# Altium footprint library adafruit.PCBLIB: 648 footprints (part 35 of 41)
Each footprint in its own frame and in the unit in brackets; x right, y up, seen from the top. Pads: shape width x height; smd on the part's side, far side on the other; paste and mask are expansions set on the pad; w line width, h text height; cw(c..) or ccw(c..) is an arc to the next point about the centre after c.
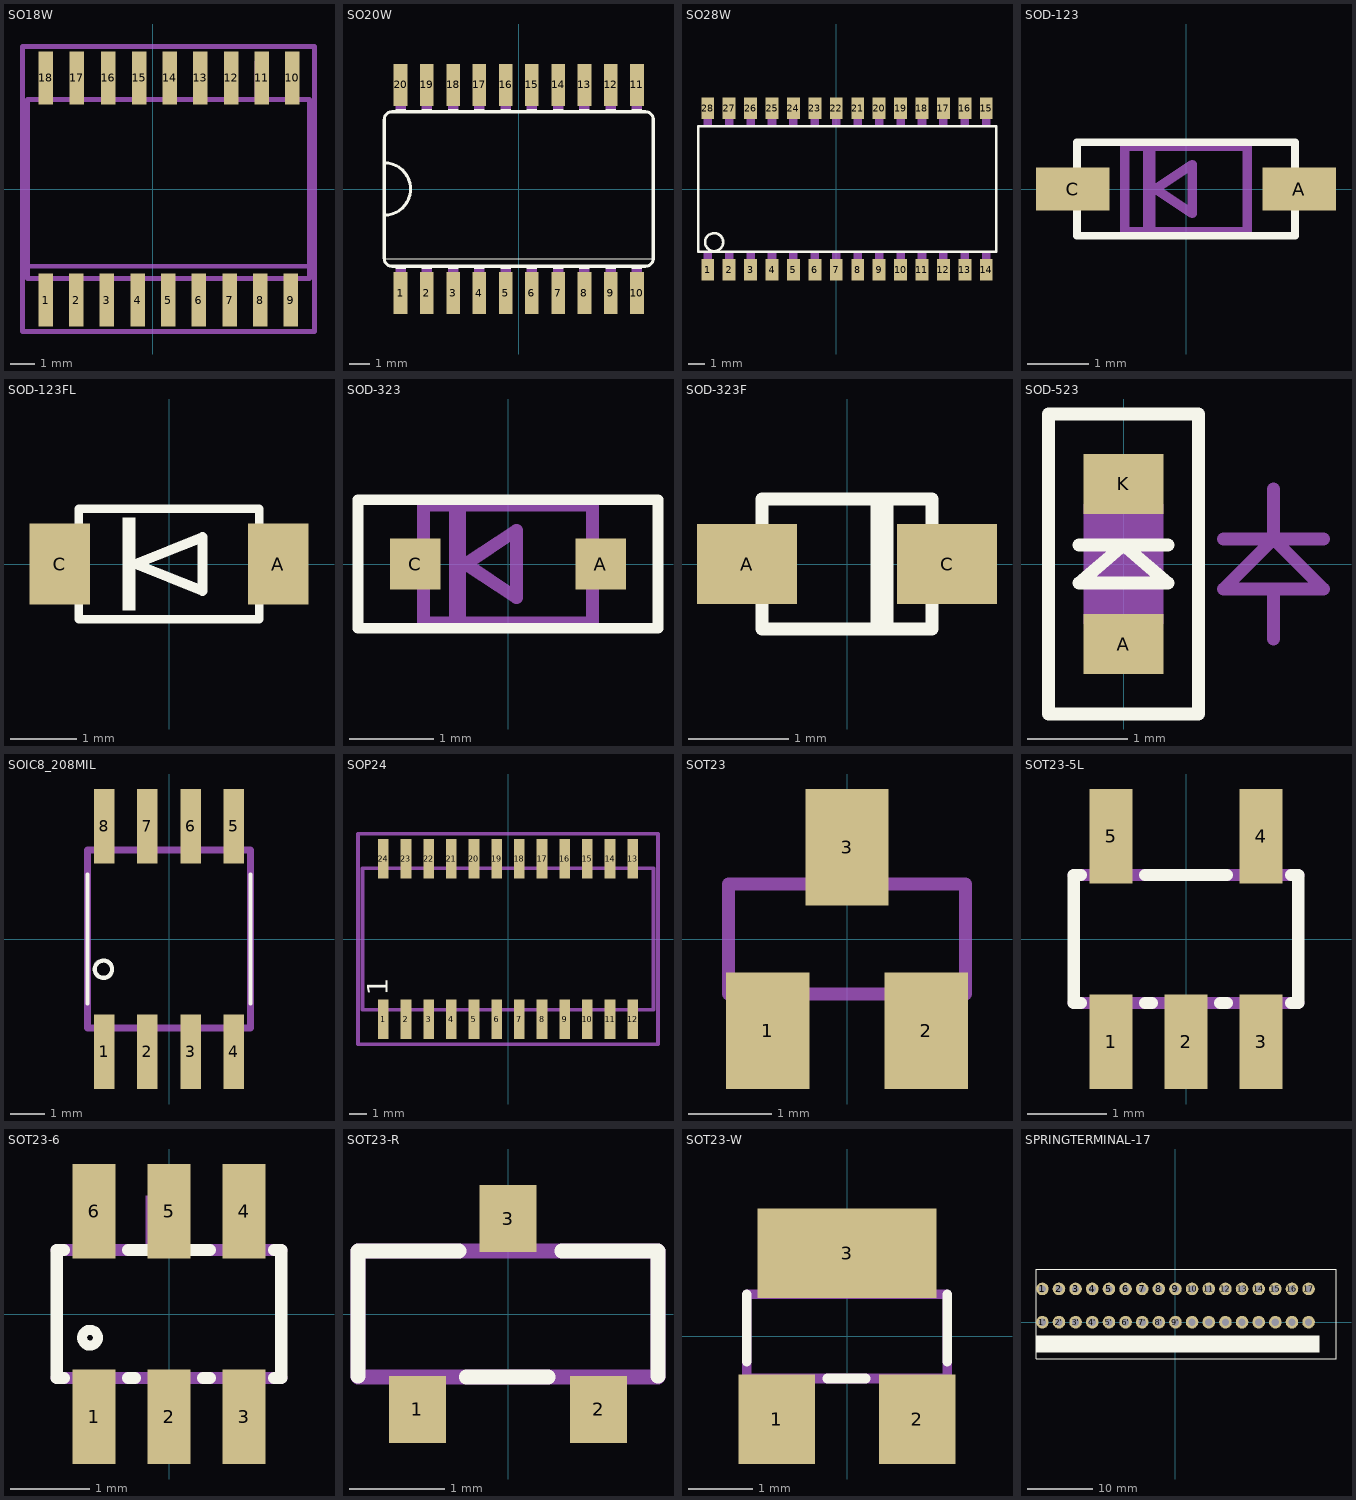
[diagram p34: the footprints below, top view; thin cyan lines are the x and y axes]

## SO18W [mil]
pads (18):
  rect 23.62x86.61 smd: 1(-175,-181.1) 2(-125,-181.1) 3(-75,-181.1) 4(-25,-181.1) 5(25,-181.1) 6(75,-181.1) 7(125,-181.1) 8(175,-181.1) 9(225,-181.1) 10(227.36,181.1) 11(177.36,181.1) 12(127.36,181.1) 13(77.36,181.1) 14(27.36,181.1) 15(-22.64,181.1) 16(-72.64,181.1) 17(-123.82,181.1) 18(-175,181.1)
Mechanical 16:
  rectangle: -184.65,-209.45 -165.35,-149.61
  rectangle: -134.65,-209.45 -115.35,-149.61
  rectangle: -84.65,-209.45 -65.35,-149.61
  rectangle: -34.65,-209.45 -15.35,-149.61
  rectangle: 15.35,-209.45 34.65,-149.61
  rectangle: 65.35,-209.45 84.65,-149.61
  rectangle: 115.35,-209.45 134.65,-149.61
  rectangle: 165.35,-209.45 184.65,-149.61
  rectangle: 215.35,149.61 234.65,209.45
  rectangle: 165.35,149.61 184.65,209.45
  rectangle: 116.53,149.61 135.83,209.45
  rectangle: 66.53,149.61 85.83,209.45
  rectangle: 16.53,149.61 35.83,209.45
  rectangle: -33.47,149.61 -14.17,209.45
  rectangle: -83.47,149.61 -64.17,209.45
  rectangle: -133.47,149.61 -114.17,209.45
  rectangle: -184.65,149.61 -165.35,209.44
  rectangle: 215.35,-209.44 234.65,-149.61
  lines w8: -204.33,-125.98 -204.33,-145.67 255.51,-145.67 255.51,-125.98 ; -204.33,-125.98 -204.33,145.67 255.51,145.67 255.51,-125.98 ; -204.33,-125.98 255.51,-125.98
Mechanical 27:
  lines w7.87: -212.4,-232.28 263.58,-232.28 263.58,232.28 -212.4,232.28 -212.4,-232.28

## SO20W [mil]
pads (20):
  rect 26x80 smd: 1(-225,-198) 2(-175,-198) 3(-125,-198) 4(-75,-198) 5(-25,-198) 6(25,-198) 7(75,-198) 8(125,-198) 9(175,-198) 10(225,-198) 11(225,198) 12(175,198) 13(125,198) 14(75,198) 15(25,198) 16(-25,198) 17(-75,198) 18(-125,198) 19(-175,198) 20(-225,198)
Top Overlay:
  rectangle: 215,-152 235,-147
  rectangle: 165,-152 185,-147
  rectangle: 215,147 235,152
  rectangle: 165,147 185,152
  rectangle: 115,147 135,152
  rectangle: 65,147 85,152
  rectangle: 15,147 35,152
  rectangle: -35,147 -15,152
  rectangle: -85,147 -65,152
  rectangle: -135,147 -115,152
  rectangle: -185,147 -165,152
  rectangle: -235,147 -215,152
  rectangle: 115,-152 135,-147
  rectangle: 65,-152 85,-147
  rectangle: 15,-152 35,-147
  rectangle: -35,-152 -15,-147
  rectangle: -85,-152 -65,-147
  rectangle: -135,-152 -115,-147
  rectangle: -185,-152 -165,-147
  rectangle: -235,-152 -215,-147
  lines w2: -255,-133 255,-133
  lines w6: -256,-50 ccw(c-256,0) -256,50 ; -256,-50 -256,-132 ccw(c-241,-132) -241,-147 241,-147 ccw(c241,-132) 256,-132 256,132 ccw(c241,132) 241,147 -241,147 ccw(c-241,132) -256,132 -256,50 ; -256,-50 -256,50
Mechanical 16:
  rectangle: 215,-210 235,-152
  rectangle: 165,-210 185,-152
  rectangle: 215,152 235,210
  rectangle: 165,152 185,210
  rectangle: 115,152 135,210
  rectangle: 65,152 85,210
  rectangle: 15,152 35,210
  rectangle: -35,152 -15,210
  rectangle: -85,152 -65,210
  rectangle: -135,152 -115,210
  rectangle: -185,152 -165,210
  rectangle: -235,152 -215,210
  rectangle: 115,-210 135,-152
  rectangle: 65,-210 85,-152
  rectangle: 15,-210 35,-152
  rectangle: -35,-210 -15,-152
  rectangle: -85,-210 -65,-152
  rectangle: -135,-210 -115,-152
  rectangle: -185,-210 -165,-152
  rectangle: -235,-210 -215,-152

## SO28W [mil]
pads (28):
  rect 30x50 smd: 1(-300,-188.19) 2(-250,-188.19) 3(-200,-188.19) 4(-150,-188.19) 5(-100,-188.19) 6(-50,-188.19) 7(0,-188.19) 8(50,-188.19) 9(100,-188.19) 10(150,-188.19) 11(200,-188.19) 12(250,-188.19) 13(300,-188.19) 14(350,-188.19) 15(350,188.19) 16(300,188.19) 17(250,188.19) 18(200,188.19) 19(150,188.19) 20(100,188.19) 21(50,188.19) 22(0,188.19) 23(-50,188.19) 24(-100,188.19) 25(-150,188.19) 26(-200,188.19) 27(-250,188.19) 28(-300,188.19)
Top Overlay:
  circle w6: c-285,-124 r21
  lines w6: -322,-146.19 373,-146.19 373,146.19 -322,146.19 -322,-146.19
Mechanical 16:
  rectangle: -310,-207.19 -290,-147.19
  rectangle: -260,-207.19 -240,-147.19
  rectangle: -210,-207.19 -190,-147.19
  rectangle: -160,-207.19 -140,-147.19
  rectangle: -110,-207.19 -90,-147.19
  rectangle: -60,-207.19 -40,-147.19
  rectangle: -10,-207.19 10,-147.19
  rectangle: 40,-207.19 60,-147.19
  rectangle: 90,-207.19 110,-147.19
  rectangle: 140,-207.19 160,-147.19
  rectangle: 190,-207.19 210,-147.19
  rectangle: 240,-207.19 260,-147.19
  rectangle: 290,-207.19 310,-147.19
  rectangle: 340,-207.19 360,-147.19
  rectangle: 340,147.19 360,207.19
  rectangle: 290,147.19 310,207.19
  rectangle: 240,147.19 260,207.19
  rectangle: 190,147.19 210,207.19
  rectangle: 140,147.19 160,207.19
  rectangle: 90,147.19 110,207.19
  rectangle: 40,147.19 60,207.19
  rectangle: -10,147.19 10,207.19
  rectangle: -60,147.19 -40,207.19
  rectangle: -110,147.19 -90,207.19
  rectangle: -160,147.19 -140,207.19
  rectangle: -210,147.19 -190,207.19
  rectangle: -260,147.19 -240,207.19
  rectangle: -310,147.19 -290,207.19

## SOD-123 [mil]
pads (2):
  rect 47.24x27.56 smd: A(72.83,0) C(-72.83,0)
Top Overlay:
  lines w5: -70,-30 70,-30 70,30 -70,30 -70,-30
Mechanical 16:
  rectangle: -27.56,-27.56 -19.69,27.56
  lines w6: -39.37,-27.56 39.37,-27.56 39.37,27.56 -39.37,27.56 -39.37,-27.56 ; -19.69,0 3.94,15.75 3.94,-15.75 -19.69,0

## SOD-123FL [mil]
pads (2):
  rect 35.83x48.03 smd: A(64.47,0) C(-64.47,0)
Top Overlay:
  rectangle: -27.56,-27.56 -19.69,27.56
  lines w5: -53.15,-32.48 53.15,-32.48 53.15,32.48 -53.15,32.48 -53.15,-32.48
  lines w6: -19.69,0 19.69,15.75 19.69,-15.75 -19.69,0

## SOD-323 [mil]
pads (2):
  rect 23.62x23.62 smd: A(43.31,0) C(-43.31,0)
Top Overlay:
  lines w5: -70,-30 -70,30 70,30 70,-30 -70,-30
Mechanical 16:
  rectangle: -27.56,-27.56 -19.69,27.56
  lines w6: -39.37,-27.56 -39.37,27.56 39.37,27.56 39.37,-27.56 -39.37,-27.56 ; -19.69,0 3.94,-15.75 3.94,15.75 -19.69,0
  text "41" at 21.93,11.48 h37.2

## SOD-323F [mm]
pads (2):
  rect 1x0.8 smd: A(-1,0) C(1,0)
Top Overlay:
  lines w0.127: 0.3,0.6 0.3,-0.6 0.4,-0.6 0.4,0.6 ; -0.85,-0.65 -0.85,0.65 0.85,0.65 0.85,-0.65 -0.85,-0.65
Mechanical 16:
  lines w0.127: -0.9,-0.2 -1.2,-0.2 -1.2,0.2 -0.9,0.2 ; 0.9,-0.2 1.2,-0.2 1.2,0.2 0.9,0.2

## SOD-523 [mil]
pads (2):
  rect 31.5x23.62 smd: A(0,-31.5) K(0,31.5)
Top Overlay:
  lines w5: -17.5,7.5 17.5,7.5 ; -29.53,-59.06 -29.53,59.06 29.53,59.06 29.53,-59.06 -29.53,-59.06 ; -17.5,-7.5 0,7.5 17.5,-7.5 -17.5,-7.5
Mechanical 16:
  rectangle: -5.91,23.62 5.91,31.5
  rectangle: -5.91,-31.5 5.91,-23.62
  rectangle: -15.75,-23.62 15.75,23.62
  lines w5: 39.37,9.84 59.06,9.84 ; 59.06,-29.53 59.06,-9.84 ; 59.06,29.53 59.06,9.84 ; 78.74,9.84 59.06,9.84 ; 59.06,-9.84 78.74,-9.84 59.06,9.84 ; 59.06,-9.84 39.37,-9.84 59.06,9.84

## SOIC8_208MIL [mil]
pads (8):
  rect 23.62x86.61 smd: 1(-75,-130.51) 2(-25,-130.51) 3(25,-130.51) 4(75,-130.51) 5(75,130.51) 6(25,130.51) 7(-25,130.51) 8(-75,130.51)
Top Overlay:
  circle w5: c-76,-35 r10
  lines w5: -94.49,-74.8 -94.49,74.8 ; 94.49,-74.8 94.49,74.8
Mechanical 16:
  rectangle: -84.65,106.89 -65.35,150.2
  rectangle: -34.65,106.89 -15.35,150.2
  rectangle: 15.35,106.89 34.65,150.2
  rectangle: 65.35,106.89 84.65,150.2
  rectangle: 65.35,-150.2 84.65,-106.89
  rectangle: 15.35,-150.2 34.65,-106.89
  rectangle: -34.65,-150.2 -15.35,-106.89
  rectangle: -84.65,-150.2 -65.35,-106.89
  lines w8: -94.49,-102.95 -94.49,102.95 94.49,102.95 94.49,-102.95 -94.49,-102.95

## SOP24 [mil]
pads (24):
  rect 23.62x86.61 smd: 1(-275,-177.17) 2(-225,-177.17) 3(-175,-177.17) 4(-125,-177.17) 5(-75,-177.17) 6(-25,-177.17) 7(25,-177.17) 8(75,-177.17) 9(125,-177.17) 10(175,-177.17) 11(225,-177.17) 12(275,-177.17) 13(275,177.17) 14(225,177.17) 15(175,177.17) 16(125,177.17) 17(75,177.17) 18(25,177.17) 19(-25,177.17) 20(-75,177.17) 21(-125,177.17) 22(-175,177.17) 23(-225,177.17) 24(-275,177.17)
Top Overlay:
  text "1" at -250,-125 h77.5
Mechanical 16:
  rectangle: -284.84,-212.2 -265.16,-159.84
  rectangle: -234.84,-212.2 -215.16,-159.84
  rectangle: -184.84,-212.2 -165.16,-159.84
  rectangle: -134.84,-212.2 -115.16,-159.84
  rectangle: -84.84,-212.2 -65.16,-159.84
  rectangle: -34.84,-212.2 -15.16,-159.84
  rectangle: 15.16,-212.2 34.84,-159.84
  rectangle: 65.16,-212.2 84.84,-159.84
  rectangle: 115.16,-212.2 134.84,-159.84
  rectangle: 165.16,-212.2 184.84,-159.84
  rectangle: 215.16,-212.2 234.84,-159.84
  rectangle: 265.16,-212.2 284.84,-159.84
  rectangle: 265.16,159.84 284.84,212.2
  rectangle: 215.16,159.84 234.84,212.2
  rectangle: 165.16,159.84 184.84,212.2
  rectangle: 115.16,159.84 134.84,212.2
  rectangle: 65.16,159.84 84.84,212.2
  rectangle: 15.16,159.84 34.84,212.2
  rectangle: -34.84,159.84 -15.16,212.2
  rectangle: -84.84,159.84 -65.16,212.2
  rectangle: -134.84,159.84 -115.16,212.2
  rectangle: -184.84,159.84 -165.16,212.2
  rectangle: -234.84,159.84 -215.16,212.2
  rectangle: -284.84,159.84 -265.16,212.2
  lines w8: -320.67,-155.91 320.67,-155.91 320.67,155.91 -320.67,155.91 -320.67,-155.91
Mechanical 27:
  lines w7.87: -330.71,-232.28 -330.71,232.28 330.71,232.28 330.71,-232.28 -330.71,-232.28

## SOT23 [mm]
pads (3):
  rect 1x1.4 smd: 1(-0.95,-1.1) 2(0.95,-1.1) 3(0,1.1)
Mechanical 16:
  rectangle: -1.168,-1.295 -0.711,-0.711
  rectangle: 0.711,-1.295 1.168,-0.711
  rectangle: -0.229,0.711 0.229,1.295
  lines w0.152: -1.422,-0.66 -1.422,0.66 1.422,0.66 1.422,-0.66 -1.422,-0.66

## SOT23-5L [mil]
pads (5):
  rect 21.65x47.24 smd: 1(-37.4,-51.18) 2(0,-51.18) 3(37.4,-51.18) 4(37.4,51.18) 5(-37.4,51.18)
Top Overlay:
  lines w6: -52.28,-31.89 -55.98,-31.89 -55.98,31.89 -52.28,31.89 ; -20.55,-31.89 -16.85,-31.89 ; -20.55,31.89 20.55,31.89 ; 16.85,-31.89 20.55,-31.89 ; 52.28,-31.89 55.98,-31.89 55.98,31.89 52.28,31.89
Mechanical 16:
  rectangle: -47.24,-59.06 -27.56,-33.46
  rectangle: -9.84,-59.06 9.84,-33.46
  rectangle: 27.56,-59.06 47.24,-33.46
  rectangle: 27.56,33.46 47.24,59.06
  rectangle: -47.24,33.46 -27.56,59.06
  lines w6: -55.98,-31.89 55.98,-31.89 ; -55.98,31.89 55.98,31.89

## SOT23-6 [mil]
pads (6):
  rect 21.65x47.24 smd: 1(-37.4,-51.18) 2(0,-51.18) 3(37.4,-51.18) 4(37.4,51.18) 5(0,51.18) 6(-37.4,51.18)
Top Overlay:
  circle w5: c-39.37,-11.81 r3.94
  lines w6: -52.28,-31.89 -55.98,-31.89 -55.98,31.89 -52.28,31.89 ; -20.55,-31.89 -16.85,-31.89 ; -20.55,31.89 20.55,31.89 ; 16.85,-31.89 20.55,-31.89 ; 52.28,-31.89 55.98,-31.89 55.98,31.89 52.28,31.89
Mechanical 16:
  rectangle: -47.24,-59.06 -27.56,-33.46
  rectangle: -9.84,-59.06 9.84,-33.46
  rectangle: 27.56,-59.06 47.24,-33.46
  rectangle: 27.56,33.46 47.24,59.06
  rectangle: -47.24,33.46 -27.56,59.06
  rectangle: -11.81,33.46 7.87,59.06
  lines w6: -55.98,-31.89 55.98,-31.89 ; -55.98,31.89 55.98,31.89

## SOT23-R [mm]
pads (3):
  rect 0.6x0.7 smd: 1(-0.95,-1) 2(0.95,-1) 3(0,1)
Top Overlay:
  lines w0.152: -1.573,-0.653 -1.573,0.66 -0.514,0.66 ; -0.436,-0.66 0.422,-0.66 ; 0.564,0.66 1.573,0.66 1.573,-0.653
Mechanical 16:
  rectangle: -1.168,-1.295 -0.711,-0.711
  rectangle: 0.711,-1.295 1.168,-0.711
  rectangle: -0.229,0.711 0.229,1.295
  lines w0.152: -1.573,-0.66 -1.573,0.66 1.573,0.66 1.573,-0.66 -1.573,-0.66

## SOT23-W [mil]
pads (3):
  rect 47.24x55.12 smd: 1(-43.31,-51.18) 2(43.31,-51.18)
  rect 110.24x55.12 smd: 3(0,51.18)
Top Overlay:
  lines w6: -61.91,-15.69 -61.91,26 ; -12.18,-26 11.63,-26 ; 61.91,-15.69 61.91,26
Mechanical 16:
  rectangle: -46,-51 -28,-28
  rectangle: 28,-51 46,-28
  rectangle: -9,28 9,51
  lines w6: -61.91,-26 -61.91,26 61.91,26 61.91,-26 -61.91,-26

## SPRINGTERMINAL-17 [mil]
pads (34):
  round 76 hole 43.31: 1(-800,200) 1'(-800,0) 2(-700,200) 2'(-700,0) 3(-600,200) 3'(-600,0) 4(-500,200) 4'(-500,0) 5(-400,200) 5'(-400,0) 6(-300,200) 6'(-300,0) 7(-200,200) 7'(-200,0) 8(-100,200) 8'(-100,0) 9(0,200) 9'(0,0) 10(100,200) 10'(100,0) 11(200,200) 11'(200,0) 12(300,200) 12'(300,0) 13(400,200) 13'(400,0) 14(500,200) 14'(500,0) 15(600,200) 15'(600,0) 16(700,200) 16'(700,0) 17(800,200) 17'(800,0)
Top Overlay:
  rectangle: -835.43,-181.1 864.57,-81.1
  lines w5: -835.43,-220.47 -835.43,318.9 964.57,318.9 964.57,-220.47 -835.43,-220.47